# Altium footprint library 400631.PcbLib: 131 footprints (part 8 of 9)
Each footprint in its own frame and in the unit in brackets; x right, y up, seen from the top. Pads: shape width x height; smd on the part's side, far side on the other; paste and mask are expansions set on the pad; w line width, h text height; cw(c..) or ccw(c..) is an arc to the next point about the centre after c.
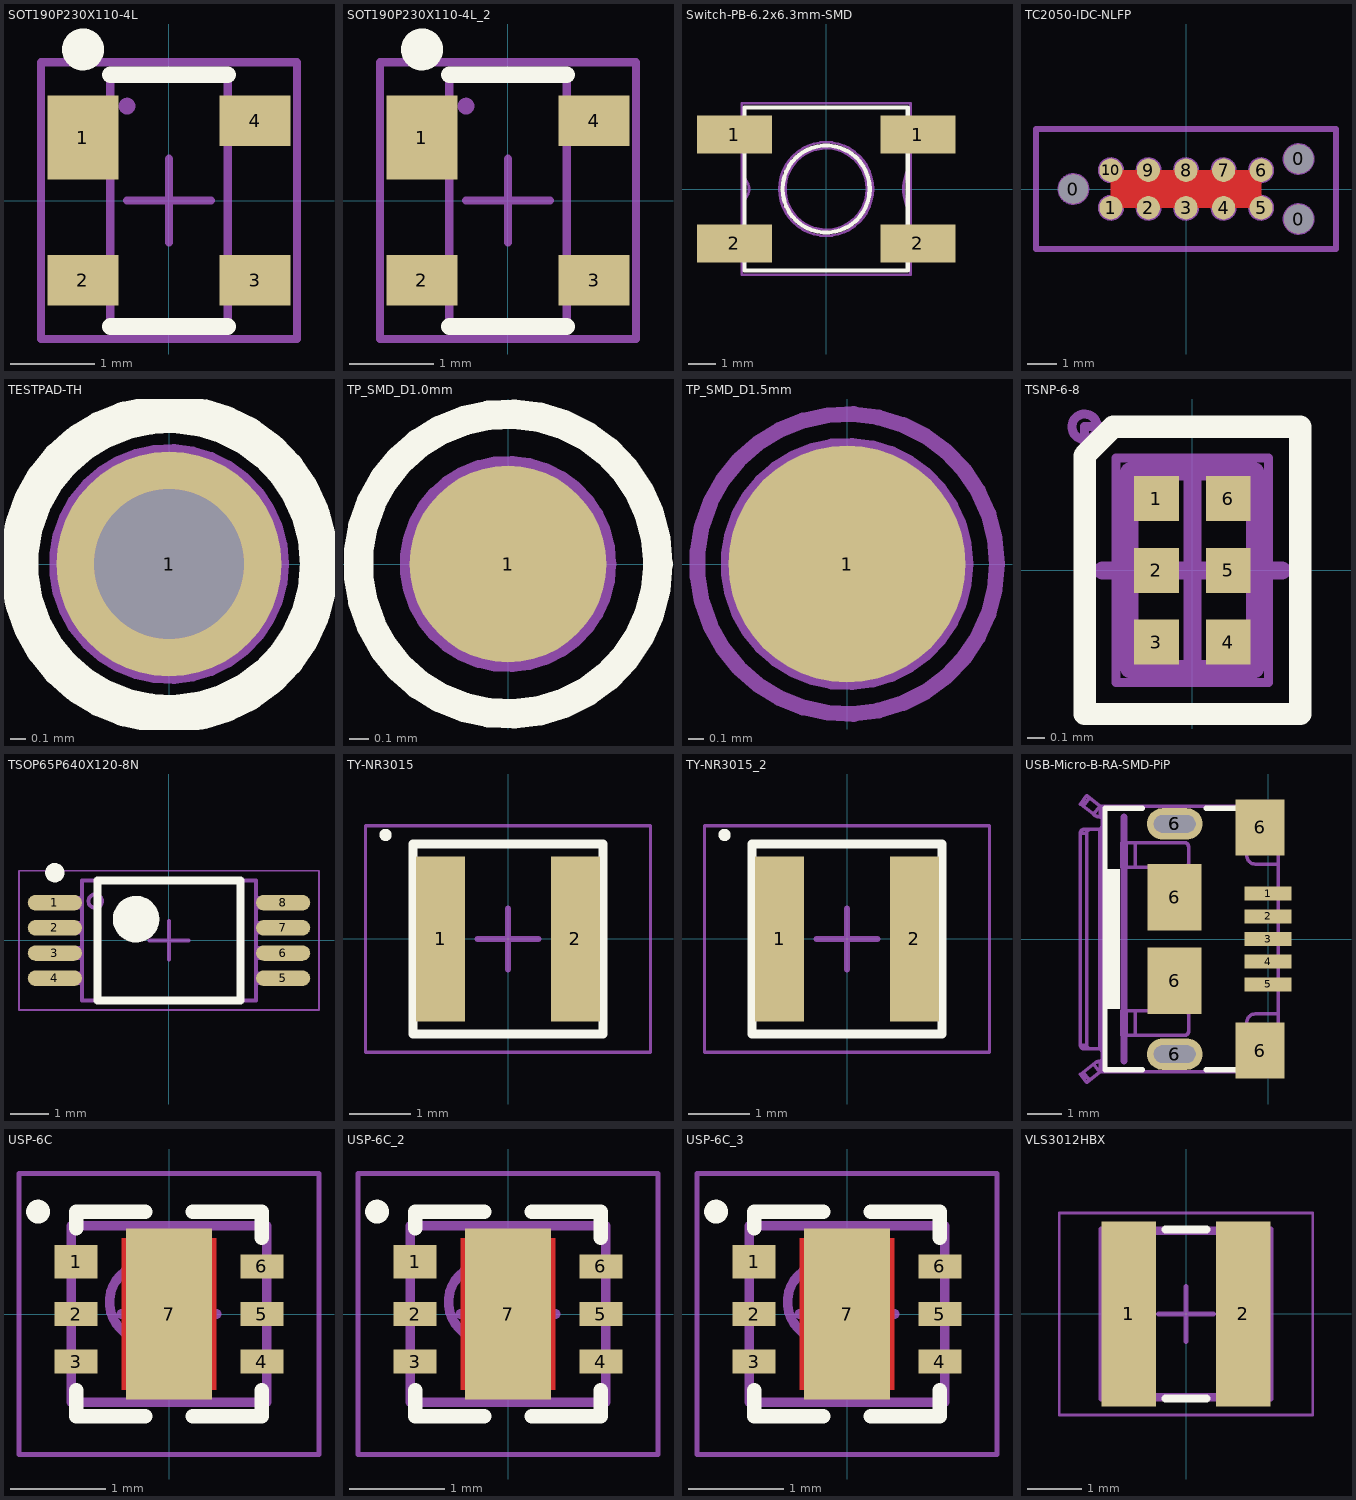
[diagram p7: the footprints below, top view; thin cyan lines are the x and y axes]

## SOT190P230X110-4L [mm] "SOT143, 4-Leads, Body 3.0x2.5mm (max), Pitch 1.90mm, IPC High Density"
height 1.1
pads (4):
  rect 0.85x1 smd: 1(-1.025,0.75)
  rect 0.85x0.6 smd: 2(-1.025,-0.95) 3(1.025,-0.95) 4(1.025,0.95)
Top Overlay:
  circle w0.25: c-1.025,1.8 r0.125
  lines w0.2: -0.7,-1.5 0.7,-1.5 ; -0.7,1.5 0.7,1.5
Mechanical 7:
  circle w0.1: c-0.5,1.125 r0.05
  lines w0.1: -0.7,-1.5 -0.7,1.5 0.7,1.5 0.7,-1.5 -0.7,-1.5
  text ".Designator" at 0.305,-0.625 h0.69
Mechanical 15:
  lines w0.1: -0.5,0 0.5,0 ; 0,-0.5 0,0.5 ; -1.525,-1.65 -1.525,1.65 1.525,1.65 1.525,-1.65 -1.525,-1.65
3D body "User Library-sot143.step": height 1, standoff 0, extent -1.21,-1.46 1.21,1.46

## SOT190P230X110-4L_2 [mm]
pads (4):
  rect 0.85x1 smd: 1(-1.025,0.75)
  rect 0.85x0.6 smd: 2(-1.025,-0.95) 3(1.025,-0.95) 4(1.025,0.95)
Top Overlay:
  circle w0.25: c-1.025,1.8 r0.125
  lines w0.2: -0.7,-1.5 0.7,-1.5 ; -0.7,1.5 0.7,1.5
Mechanical 7:
  circle w0.1: c-0.5,1.125 r0.05
  lines w0.1: -0.7,-1.5 0.7,-1.5 0.7,1.5 -0.7,1.5 -0.7,-1.5
  text ".Designator" at 0.463,0.379 h0.69
Mechanical 15:
  lines w0.1: -0.5,0 0.5,0 ; 0,-0.5 0,0.5 ; -1.525,-1.65 1.525,-1.65 1.525,1.65 -1.525,1.65 -1.525,-1.65
3D body "User Library-sot143.step": height 1, standoff 0, extent -1.21,-1.46 1.21,1.46

## Switch-PB-6.2x6.3mm-SMD [mm] "6.2×6.5mm TACT Switch, without ground connector"
height 2.5
pads (4):
  rect 2.75x1.4 smd: 1(-3.375,2) 1(3.375,2) 2(-3.375,-2) 2(3.375,-2)
Top Overlay:
  circle w0.152: c0,0 r1.601
  lines w0.152: -3,-3 -3,3 3,3 3,-3 -3,-3
Mechanical 7:
  circle w0.1: c0,0 r1.721
  circle w0.1: c0,0 r1.5
  lines w0.1: -3.3,-2.393 -3.3,-1.606 ; -3.3,1.606 -3.3,2.393 ; -3.1,-2.393 -3.6,-2.393 -3.6,-1.606 -3.1,-1.606 ; -3.1,-0.441 ccw(c-3.335,0) -3.1,0.441 ; -3.1,1.606 -3.6,1.606 -3.6,2.393 -3.1,2.393 ; 3.1,-2.393 3.6,-2.393 3.6,-1.606 3.1,-1.606 ; 3.1,-0.91 cw(c4.561,0) 3.1,0.91 ; 3.1,1.606 3.6,1.606 3.6,2.393 3.1,2.393 ; 3.3,-2.393 3.3,-1.606 ; 3.3,1.606 3.3,2.393 ; -3.1,-3.15 -3.1,3.15 3.1,3.15 3.1,-3.15 -3.1,-3.15
  text ".Designator" at -0.475,-0.15 h0.38
3D body "TS604VM1-025BR-R.step": height 2.5, standoff 0, extent -3.6,-3.1 3.6,3.1

## TC2050-IDC-NLFP [mil]
pads (13):
  round 39 hole 39 unplated mask+3: 0(-150,0) 0(150,-40) 0(150,40)
  round 31 smd paste-196.85: 1(-100,-25) 2(-50,-25) 3(0,-25) 4(50,-25) 5(100,-25) 6(100,25) 7(50,25) 8(0,25) 9(-50,25) 10(-100,25)
Top Layer:
  pour cut-out: -100,25 -100,-25 100,-25 100,25
Mechanical 7:
  circle w3.94: c-100,24.99 r15.45
  circle w3.94: c-100,-24.99 r15.45
  circle w3.94: c-50,-24.99 r15.45
  circle w3.94: c0,-24.99 r15.45
  circle w3.94: c0,24.99 r15.45
  circle w3.94: c-50,24.99 r15.45
  circle w3.94: c50,24.99 r15.45
  circle w3.94: c50,-24.99 r15.45
  circle w3.94: c100,-24.99 r15.45
  circle w3.94: c100,24.99 r15.45
  circle w3.94: c150,-39.98 r19.26
  circle w3.94: c150,39.98 r19.26
  circle w3.94: c-150,0 r19.26
  text ".Designator" at 171,14 h15
Mechanical 8:
  circle w3.94: c-150,0 r19.26
  circle w3.94: c150,39.98 r19.26
  circle w3.94: c150,-39.98 r19.26
Mechanical 15:
  lines w7.87: -199.8,-79.92 -199.8,79.92 199.8,79.92 199.8,-79.92 -199.8,-79.92

## TESTPAD-TH [mm]
height 12
pads (1):
  round 1.5 hole 1: 1(0,0)
Top Overlay:
  circle w0.254: c0,0 r1
Mechanical 7:
  circle w0.1: c0,0 r1
  circle w0.1: c0,0 r0.75
  circle w0.1: c0,0 r0.5
  text ".Designator" at -0.5,1.15 h0.38

## TP_SMD_D1.0mm [mm] "Test point - pad 1.0mm"
pads (1):
  round 1 smd paste-5: 1(0,0)
Top Overlay:
  circle w0.15: c0,0 r0.762
Mechanical 7:
  circle w0.1: c0,0 r0.762
  circle w0.1: c0,0 r0.5
  text ".Designator" at -0.752,-1.333 h0.38

## TP_SMD_D1.5mm [mm] "Test point - pad 1.5mm"
pads (1):
  round 1.5 smd paste-5: 1(0,0)
Mechanical 7:
  circle w0.1: c0,0 r0.75
  circle w0.1: c0,0 r0.95
  text ".Designator" at -0.9,1.175 h0.38
3D body: height 0.05, standoff 0, extent -0.75,-0.75 0.75,0.75

## TSNP-6-8 [mm] "LGA, 6-Leads, Body 0,70x1,10mmx0,38mm, Pitch 0,40mm"
height 0.38
pads (6):
  rect 0.25x0.25 smd paste-0.03 mask+0.08: 1(-0.2,0.4) 2(-0.2,0) 3(-0.2,-0.4) 4(0.2,-0.4) 5(0.2,0) 6(0.2,0.4)
Top Overlay:
  lines w0.125: -0.6,-0.8 -0.6,0.639 -0.439,0.8 0.6,0.8 0.6,-0.8 -0.6,-0.8
Mechanical 7:
  circle w0.05: c-0.6,0.8 r0.071
  lines w0.05: -0.425,-0.625 0.425,-0.625 0.425,0.625 -0.425,0.625 -0.425,-0.625
  text ".Designator" at -0.094,1.469 h0.3
Mechanical 13:
  lines w0.1: -0.35,-0.55 0.35,-0.55 0.35,0.55 -0.35,0.55 -0.35,-0.55
Mechanical 15:
  lines w0.05: -0.6,-0.8 0.6,-0.8 0.6,0.8 -0.6,0.8 -0.6,-0.8
  lines w0.1: -0.5,0 0.5,0 ; 0,-0.5 0,0.5
3D body "LGA6C40P2X3_70X110X38.step": height 0.38, standoff 0, extent -0.375,-0.575 0.375,0.575

## TSOP65P640X120-8N [mm] "TSOP, 8-Leads, Body 3.00x4.40mm, Pitch 0.65mm, IPC Medium Density"
height 1.2
pads (8):
  oval 1.4x0.4 smd: 1(-2.95,0.975) 2(-2.95,0.325) 3(-2.95,-0.325) 4(-2.95,-0.975) 5(2.95,-0.975) 6(2.95,-0.325) 7(2.95,0.325) 8(2.95,0.975)
Top Overlay:
  circle w0.6: c-0.85,0.55 r0.3
  circle w0.25: c-2.95,1.75 r0.125
  lines w0.2: -1.85,-1.55 1.85,-1.55 1.85,1.55 -1.85,1.55 -1.85,-1.55
Mechanical 7:
  circle w0.1: c-1.905,1.016 r0.175
  lines w0.1: -2.25,-1.55 2.25,-1.55 2.25,1.55 -2.25,1.55 -2.25,-1.55
  lines w0.102: -2.25,-1.1 -3.25,-1.1 -3.25,-0.85 -2.25,-0.85 ; -2.25,-0.45 -3.25,-0.45 -3.25,-0.2 -2.25,-0.2 ; -2.25,0.2 -3.25,0.2 -3.25,0.45 -2.25,0.45 ; -2.25,0.85 -3.25,0.85 -3.25,1.1 -2.25,1.1 ; 2.25,-1.1 3.25,-1.1 3.25,-0.85 2.25,-0.85 ; 2.25,-0.45 3.25,-0.45 3.25,-0.2 2.25,-0.2 ; 2.25,0.2 3.25,0.2 3.25,0.45 2.25,0.45 ; 2.25,0.85 3.25,0.85 3.25,1.1 2.25,1.1
  text ".Designator" at -0.381,-0.279 h0.38
Mechanical 15:
  lines w0.05: -3.875,-1.8 3.875,-1.8 3.875,1.8 -3.875,1.8 -3.875,-1.8
  lines w0.1: -0.5,0 0.5,0 ; 0,-0.5 0,0.5
3D body "TSOP65P640X120-8N_asfdasdf.step": height 1.2, standoff 0, extent -3.2,-1.55 3.2,1.55

## TY-NR3015 [mm] "Molded Inductor, 2-Leads, Body 3.00x3.00mm, IPC Medium Density"
height 1.5
pads (2):
  rect 0.8x2.7 smd: 1(-1.1,0) 2(1.1,0)
Top Overlay:
  circle w0.1: c-2,1.7 r0.05
  lines w0.15: -1.55,-1.55 1.55,-1.55 1.55,1.55 -1.55,1.55 -1.55,-1.55
Mechanical 7:
  lines w0.1: -1.55,-1.55 -1.55,1.55 1.55,1.55 1.55,-1.55 -1.55,-1.55
  text ".Designator" at 0.1,-0.349 h0.38
Mechanical 13:
  lines w0.1: -1.55,-1.55 -1.55,1.55 1.55,1.55 1.55,-1.55 -1.55,-1.55
Mechanical 15:
  lines w0.05: -2.325,-1.85 2.325,-1.85 2.325,1.85 -2.325,1.85 -2.325,-1.85
  lines w0.1: -0.5,0 0.5,0 ; 0,-0.5 0,0.5
3D body "User Library-nr3015.step": height 1.35, standoff -0.15, extent -1.5,-1.5 1.5,1.5

## TY-NR3015_2 [mm]
pads (2):
  rect 0.8x2.7 smd: 1(-1.1,0) 2(1.1,0)
Top Overlay:
  circle w0.1: c-2,1.7 r0.05
  lines w0.15: -1.55,-1.55 -1.55,1.55 1.55,1.55 1.55,-1.55 -1.55,-1.55
Mechanical 7:
  text ".Designator" at 0.152,-0.254 h0.38
Mechanical 13:
  lines w0.1: -1.55,-1.55 -1.55,1.55 1.55,1.55 1.55,-1.55 -1.55,-1.55
Mechanical 15:
  lines w0.05: -2.325,-1.85 -2.325,1.85 2.325,1.85 2.325,-1.85 -2.325,-1.85
  lines w0.1: -0.5,0 0.5,0 ; 0,-0.5 0,0.5
3D body "User Library-nr3015.step": height 1.35, standoff -0.15, extent -1.5,-1.5 1.5,1.5

## USB-Micro-B-RA-SMD-PiP [mm] "Micro USB B SMT"
height 3
pads (13):
  rect 1.35x0.4 smd mask+0.075: 1(0,1.3) 2(0,0.65) 3(0,0) 4(0,-0.65) 5(0,-1.3)
  oval 1.6x0.9 hole 0.5 slot 1.2 at 0 deg: 6(-2.675,-3.3) 6(-2.675,3.3)
  oval 2x1.5 on Top Paste: 6(-2.675,-3.3) 6(-2.675,3.3)
  rect 1.55x1.9 smd: 6(-2.675,-1.2) 6(-2.675,1.2)
  rect 1.4x1.6 smd: 6(-0.225,-3.2) 6(-0.225,3.2)
Top Overlay:
  rectangle: -4.75,-2 -4.25,2
  lines w0.152: -3.6,-3.75 -4.675,-3.75 -4.675,3.75 -3.6,3.75 ; -1.775,-3.75 0.25,-3.75 0.25,-3.275 ; -1.775,3.75 0.25,3.75 0.25,3.275
Mechanical 7:
  drawing of 2738 lines, arcs and shapes, not listed
  text ".Designator" at -2.727,-0.203 h0.38
Mechanical 15:
  lines w0.2: -4.125,-3.5 -4.125,3.5
3D body "User Library-MicroUSB-B_Molex_105017-0001.step": height 2.72, standoff -0.59, extent -5.28,-4.1 0.15,4.1

## USP-6C [mm] "DFN, 6-Leads, Body 2.00x1.80mm, Pitch 0.50mm, Thermal Pad 1.00x1.40mm, IPC Medium Density"
height 0.6
pads (7):
  rect 0.45x0.35 smd paste-0.05 mask+0.075: 1(-0.975,0.55)
  rect 0.45x0.25 smd paste-0.05 mask+0.075: 2(-0.975,0) 3(-0.975,-0.5) 4(0.975,-0.5) 5(0.975,0) 6(0.975,0.5)
  rect 0.9x1.8 smd paste-2: 7(0,0)
Top Layer:
  rectangle: -0.5,-0.8 0.5,0.8
Top Overlay:
  circle w0.15: c-1.375,1.075 r0.05
  lines w0.15: -0.975,-0.8 -0.975,-1.075 -0.25,-1.075 ; -0.975,0.9 -0.975,1.075 -0.25,1.075 ; 0.25,-1.075 0.975,-1.075 0.975,-0.8 ; 0.25,1.075 0.975,1.075 0.975,0.8
Top Paste:
  rectangle: 0.8,0.375 1.15,0.625
  rectangle: 0.8,-0.125 1.15,0.125
  rectangle: 0.8,-0.625 1.15,-0.375
  rectangle: -1.15,-0.625 -0.8,-0.375
  rectangle: -1.15,-0.125 -0.8,0.125
  rectangle: -1.15,0.375 -0.8,0.725
  region: 0.4,-0.3 -0.4,-0.3 -0.4,-0.6 0.4,-0.6
  region: 0.25,-0.325 -0.25,-0.325 -0.25,-0.7 0.25,-0.7
  rectangle: -0.25,0.325 0.25,0.7
  rectangle: -0.4,0.3 0.4,0.6
Mechanical 7:
  circle w0.1: c-0.225,0.125 r0.4
  lines w0.1: -1.025,-0.925 1.025,-0.925 1.025,0.925 -1.025,0.925 -1.025,-0.925
  text ".Designator" at 0.125,-0.6 h0.38
Mechanical 15:
  lines w0.05: -1.575,-1.475 1.575,-1.475 1.575,1.475 -1.575,1.475 -1.575,-1.475
  lines w0.1: -0.5,0 0.5,0 ; 0,-0.5 0,0.5
3D body "QFN50P200X180X60_HS-7N.step": height 0.6, standoff 0, extent -0.926,-1.025 0.926,1.025

## USP-6C_2 [mm]
pads (7):
  rect 0.45x0.35 smd paste-0.05 mask+0.075: 1(-0.975,0.55)
  rect 0.45x0.25 smd paste-0.05 mask+0.075: 2(-0.975,0) 3(-0.975,-0.5) 4(0.975,-0.5) 5(0.975,0) 6(0.975,0.5)
  rect 0.9x1.8 smd paste-2: 7(0,0)
Top Layer:
  rectangle: -0.5,-0.8 0.5,0.8
Top Overlay:
  circle w0.15: c-1.375,1.075 r0.05
  lines w0.15: -0.975,-0.8 -0.975,-1.075 -0.25,-1.075 ; -0.975,0.9 -0.975,1.075 -0.25,1.075 ; 0.25,-1.075 0.975,-1.075 0.975,-0.8 ; 0.25,1.075 0.975,1.075 0.975,0.8
Top Paste:
  rectangle: -0.4,0.3 0.4,0.6
  rectangle: -0.25,0.326 0.25,0.701
  region: 0.25,-0.324 -0.25,-0.324 -0.25,-0.699 0.25,-0.699
  region: 0.4,-0.3 -0.4,-0.3 -0.4,-0.6 0.4,-0.6
  rectangle: -1.15,0.375 -0.8,0.725
  rectangle: -1.15,-0.125 -0.8,0.125
  rectangle: -1.15,-0.625 -0.8,-0.375
  rectangle: 0.8,-0.625 1.15,-0.375
  rectangle: 0.8,-0.125 1.15,0.125
  rectangle: 0.8,0.375 1.15,0.625
Mechanical 7:
  circle w0.1: c-0.225,0.125 r0.4
  lines w0.1: -1.025,-0.925 -1.025,0.925 1.025,0.925 1.025,-0.925 -1.025,-0.925
  text ".Designator" at 0.125,-0.6 h0.38
Mechanical 15:
  lines w0.05: -1.575,-1.475 -1.575,1.475 1.575,1.475 1.575,-1.475 -1.575,-1.475
  lines w0.1: -0.5,0 0.5,0 ; 0,-0.5 0,0.5
3D body "QFN50P200X180X60_HS-7N.step": height 0.6, standoff 0, extent -0.926,-1.025 0.926,1.025

## USP-6C_3 [mm]
pads (7):
  rect 0.45x0.35 smd paste-0.05 mask+0.075: 1(-0.975,0.55)
  rect 0.45x0.25 smd paste-0.05 mask+0.075: 2(-0.975,0) 3(-0.975,-0.5) 4(0.975,-0.5) 5(0.975,0) 6(0.975,0.5)
  rect 0.9x1.8 smd paste-2: 7(0,0)
Top Layer:
  rectangle: -0.5,-0.8 0.5,0.8
Top Overlay:
  circle w0.15: c-1.375,1.075 r0.05
  lines w0.15: -0.975,-0.8 -0.975,-1.075 -0.25,-1.075 ; -0.975,0.9 -0.975,1.075 -0.25,1.075 ; 0.25,-1.075 0.975,-1.075 0.975,-0.8 ; 0.25,1.075 0.975,1.075 0.975,0.8
Top Paste:
  rectangle: 0.8,0.375 1.15,0.625
  rectangle: 0.8,-0.125 1.15,0.125
  rectangle: 0.8,-0.625 1.15,-0.375
  rectangle: -1.15,-0.625 -0.8,-0.375
  rectangle: -1.15,-0.125 -0.8,0.125
  rectangle: -1.15,0.375 -0.8,0.725
  region: 0.4,-0.3 -0.4,-0.3 -0.4,-0.6 0.4,-0.6
  region: 0.25,-0.325 -0.25,-0.325 -0.25,-0.7 0.25,-0.7
  rectangle: -0.25,0.325 0.25,0.7
  rectangle: -0.4,0.3 0.4,0.6
Mechanical 7:
  circle w0.1: c-0.225,0.125 r0.4
  lines w0.1: -1.025,-0.925 1.025,-0.925 1.025,0.925 -1.025,0.925 -1.025,-0.925
  text ".Designator" at 0,-0.737 h0.38
Mechanical 15:
  lines w0.05: -1.575,-1.475 1.575,-1.475 1.575,1.475 -1.575,1.475 -1.575,-1.475
  lines w0.1: -0.5,0 0.5,0 ; 0,-0.5 0,0.5
3D body "QFN50P200X180X60_HS-7N.step": height 0.6, standoff 0, extent -0.926,-1.025 0.926,1.025

## VLS3012HBX [mm] "4.7µH Shielded Wirewound Inductor 2.23A 201 mOhm Max Nonstandard"
height 1.2
pads (2):
  rect 1x3.4 smd: 1(-1.05,0) 2(1.05,0)
Top Overlay:
  lines w0.15: -0.375,-1.55 0.375,-1.55 ; -0.375,1.55 0.375,1.55
Mechanical 7:
  lines w0.1: -1.5,-1.5 1.5,-1.5 1.5,1.5 -1.5,1.5 -1.5,-1.5
  text ".Designator" at -1.143,0 h0.38
Mechanical 13:
  lines w0.1: -1.55,-1.55 1.55,-1.55 1.55,1.55 -1.55,1.55 -1.55,-1.55
Mechanical 15:
  lines w0.05: -2.325,-1.85 -2.325,1.85 2.325,1.85 2.325,-1.85 -2.325,-1.85
  lines w0.1: -0.5,0 0.5,0 ; 0,-0.5 0,0.5
3D body "VLS3012HBX.step": height 1.2, standoff 0, extent -1.53,-1.509 1.53,1.509